# Altium integrated library Converter_LIB.IntLib: 1 symbol
Pins are listed as number, name and electrical type; pins without a type are passive.

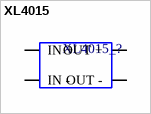
[diagram p0: symbol XL4015]

## XL4015
designator XL4015_?  (value not drawn)
footprint XL4015
pins: 0 IN +, 1 IN -, 1 OUT -, 2 OUT +